# Altium footprint library SAMTEC THD.PcbLib: 161 footprints (part 7 of 12) (continued)
## SAMTEC_SSW-150-01-L-D [mm] "100 Contacts - Pitch 2.54mm - Double Row Through Mount Straight Header"
height 8.51
pads (100):
  round 1.7 hole 1: 1(-62.23,1.27) 2(-62.23,-1.27) 3(-59.69,1.27) 4(-59.69,-1.27) 5(-57.15,1.27) 6(-57.15,-1.27) 7(-54.61,1.27) 8(-54.61,-1.27) 9(-52.07,1.27) 10(-52.07,-1.27) 11(-49.53,1.27) 12(-49.53,-1.27) 13(-46.99,1.27) 14(-46.99,-1.27) 15(-44.45,1.27) 16(-44.45,-1.27) 17(-41.91,1.27) 18(-41.91,-1.27) 19(-39.37,1.27) 20(-39.37,-1.27) 21(-36.83,1.27) 22(-36.83,-1.27) 23(-34.29,1.27) 24(-34.29,-1.27) 25(-31.75,1.27) 26(-31.75,-1.27) 27(-29.21,1.27) 28(-29.21,-1.27) 29(-26.67,1.27) 30(-26.67,-1.27) 31(-24.13,1.27) 32(-24.13,-1.27) 33(-21.59,1.27) 34(-21.59,-1.27) 35(-19.05,1.27) 36(-19.05,-1.27) 37(-16.51,1.27) 38(-16.51,-1.27) 39(-13.97,1.27) 40(-13.97,-1.27) 41(-11.43,1.27) 42(-11.43,-1.27) 43(-8.89,1.27) 44(-8.89,-1.27) 45(-6.35,1.27) 46(-6.35,-1.27) 47(-3.81,1.27) 48(-3.81,-1.27) 49(-1.27,1.27) 50(-1.27,-1.27) 51(1.27,1.27) 52(1.27,-1.27) 53(3.81,1.27) 54(3.81,-1.27) 55(6.35,1.27) 56(6.35,-1.27) 57(8.89,1.27) 58(8.89,-1.27) 59(11.43,1.27) 60(11.43,-1.27) 61(13.97,1.27) 62(13.97,-1.27) 63(16.51,1.27) 64(16.51,-1.27) 65(19.05,1.27) 66(19.05,-1.27) 67(21.59,1.27) 68(21.59,-1.27) 69(24.13,1.27) 70(24.13,-1.27) 71(26.67,1.27) 72(26.67,-1.27) 73(29.21,1.27) 74(29.21,-1.27) 75(31.75,1.27) 76(31.75,-1.27) 77(34.29,1.27) 78(34.29,-1.27) 79(36.83,1.27) 80(36.83,-1.27) 81(39.37,1.27) 82(39.37,-1.27) 83(41.91,1.27) 84(41.91,-1.27) 85(44.45,1.27) 86(44.45,-1.27) 87(46.99,1.27) 88(46.99,-1.27) 89(49.53,1.27) 90(49.53,-1.27) 91(52.07,1.27) 92(52.07,-1.27) 93(54.61,1.27) 94(54.61,-1.27) 95(57.15,1.27) 96(57.15,-1.27) 97(59.69,1.27) 98(59.69,-1.27) 99(62.23,1.27) 100(62.23,-1.27)
Top Overlay:
  circle w0.3: c-62.265,3.135 r0.15
  lines w0.2: -63.754,-2.477 63.754,-2.477 63.754,2.477 -63.754,2.477 -63.754,-2.477
  text "2" at -65.002,-1.843 h1.2
  text "99" at 64.3,0.69 h1.2
  text "100" at 64.3,-1.85 h1.2
  text "1" at -64.752,0.697 h1.2
Mechanical 8:
  drawing of 404 lines, arcs and shapes, not listed
Mechanical 14:
  drawing of 1205 lines, arcs and shapes, not listed
  text "2" at -65.002,-1.843 h1.2
  text "99" at 64.3,0.69 h1.2
  text "100" at 64.3,-1.85 h1.2
  text "1" at -64.752,0.697 h1.2
3D body "SAMTEC_SSW-150-01-L-D.stp": height 8.51, standoff -2.64, extent -63.754,-2.476 63.754,2.477

## SAMTEC_TFM-106-01-L-D-A [mm] "12 Contacts, Pitch 1.27mm, Dual Row Through Mount Straight Header With Alignment Pin, Lead Style Height 5.59mm"
height 5.59
pads (14):
  rrect50% 1.05x1.05 hole 0.65: 1(3.175,0.635) 2(3.175,-0.635) 3(1.905,0.635) 4(1.905,-0.635) 5(0.635,0.635) 6(0.635,-0.635) 7(-0.635,0.635) 8(-0.635,-0.635) 9(-1.905,0.635) 10(-1.905,-0.635) 11(-3.175,0.635) 12(-3.175,-0.635)
  round 0.5 hole 1.4 unplated mask+0.45: MECH1(-4.762,0) MECH2(4.763,0)
Top Overlay:
  circle w0.3: c3.15,3.402 r0.15
  lines w0.2: -5.397,-1.333 -4.508,-1.333 ; -5.397,-0.953 -5.313,-0.953 ; -5.397,-0.898 -5.397,-2.222 -4.762,-2.858 5.398,-2.858 5.398,-0.898 ; -5.397,0.898 -5.397,2.222 -4.762,2.858 5.398,2.858 5.398,0.898 ; -5.397,1.333 -4.508,1.333 ; -4.212,-0.953 -4.127,-0.953 -4.508,-1.333 ; -4.127,-2.222 -4.127,-0.898 ; -4.127,0.898 -4.127,1.714 4.128,1.714 ; -4.127,0.953 -4.508,1.333 ; -1.333,-2.095 4.509,-2.095 ; 4.128,-0.898 4.128,-1.714 ; 4.128,0.898 4.128,1.714 ; 4.212,-0.953 4.128,-0.953 4.509,-1.333 ; 4.212,0.953 4.128,0.953 4.509,1.333 ; 5.313,-0.953 5.398,-0.953 ; 5.313,0.953 5.398,0.953 ; 5.398,-1.333 4.509,-1.333 ; 5.398,1.333 4.509,1.333 ; -4.508,-1.333 -4.508,-2.222 -1.333,-2.222 -1.333,-1.714 4.128,-1.714 ; -4.508,1.333 -4.508,2.095 4.509,2.095 ; 4.128,-1.714 4.509,-2.095 ; 4.128,1.714 4.509,2.095 ; 4.509,-2.095 4.509,-1.333 ; 4.509,1.333 4.509,2.095
  text "1" at 3.918,3.302 h1
Mechanical 8:
  lines w0.1: -5.262,0 -4.762,0 ; -4.762,-0.5 -4.762,0 ; -4.762,0.5 -4.762,0 ; -4.262,0 -4.762,0 ; -3.675,-0.635 -3.175,-0.635 ; -3.675,0.635 -3.175,0.635 ; -3.175,-1.135 -3.175,-0.635 ; -3.175,-0.135 -3.175,-0.635 ; -3.175,0.135 -3.175,0.635 ; -3.175,1.135 -3.175,0.635 ; -2.675,-0.635 -3.175,-0.635 ; -2.675,0.635 -3.175,0.635 ; -2.405,-0.635 -1.905,-0.635 ; -2.405,0.635 -1.905,0.635 ; -1.905,-1.135 -1.905,-0.635 ; -1.905,-0.135 -1.905,-0.635 ; -1.905,0.135 -1.905,0.635 ; -1.905,1.135 -1.905,0.635 ; -1.405,-0.635 -1.905,-0.635 ; -1.405,0.635 -1.905,0.635 ; -1.135,-0.635 -0.635,-0.635 ; -1.135,0.635 -0.635,0.635 ; -0.635,-1.135 -0.635,-0.635 ; -0.635,-0.135 -0.635,-0.635 ; -0.635,0.135 -0.635,0.635 ; -0.635,1.135 -0.635,0.635 ; -0.354,-0.354 0,0 ; -0.354,0.354 0,0 ; -0.135,-0.635 -0.635,-0.635 ; -0.135,0.635 -0.635,0.635 ; 0.135,-0.635 0.635,-0.635 ; 0.135,0.635 0.635,0.635 ; 0.354,-0.354 0,0 ; 0.354,0.354 0,0 ; 0.635,-1.135 0.635,-0.635 ; 0.635,-0.135 0.635,-0.635 ; 0.635,0.135 0.635,0.635 ; 0.635,1.135 0.635,0.635 ; 1.135,-0.635 0.635,-0.635 ; 1.135,0.635 0.635,0.635 ; 1.405,-0.635 1.905,-0.635 ; 1.405,0.635 1.905,0.635 ; 1.905,-1.135 1.905,-0.635 ; 1.905,-0.135 1.905,-0.635 ; 1.905,0.135 1.905,0.635 ; 1.905,1.135 1.905,0.635 ; 2.405,-0.635 1.905,-0.635 ; 2.405,0.635 1.905,0.635 ; 2.675,-0.635 3.175,-0.635 ; 2.675,0.635 3.175,0.635 ; 3.175,-1.135 3.175,-0.635 ; 3.175,-0.135 3.175,-0.635 ; 3.175,0.135 3.175,0.635 ; 3.175,1.135 3.175,0.635 ; 3.675,-0.635 3.175,-0.635 ; 3.675,0.635 3.175,0.635 ; 4.263,0 4.763,0 ; 4.763,-0.5 4.763,0 ; 4.763,0.5 4.763,0 ; 5.263,0 4.763,0
Mechanical 14:
  circle w0.1: c3.175,-0.635 r0.229
  circle w0.1: c3.175,0.635 r0.229
  circle w0.1: c1.905,-0.635 r0.229
  circle w0.1: c1.905,0.635 r0.229
  circle w0.1: c0.635,-0.635 r0.229
  circle w0.1: c0.635,0.635 r0.229
  circle w0.1: c-0.635,-0.635 r0.229
  circle w0.1: c-0.635,0.635 r0.229
  circle w0.1: c-1.905,-0.635 r0.229
  circle w0.1: c-1.905,0.635 r0.229
  circle w0.1: c-3.175,-0.635 r0.229
  circle w0.1: c-3.175,0.635 r0.229
  circle w0.3: c3.15,3.402 r0.15
  lines w0.1: -5.397,-1.333 -4.508,-1.333 ; -5.397,-0.953 -4.127,-0.953 -4.508,-1.333 ; -5.397,1.333 -4.508,1.333 ; -4.127,-2.222 -4.127,1.714 4.128,1.714 ; -4.127,0.953 -4.508,1.333 ; -1.333,-2.095 4.509,-2.095 ; 5.398,-1.333 4.509,-1.333 ; 5.398,-0.953 4.128,-0.953 4.509,-1.333 ; 5.398,0.953 4.128,0.953 4.509,1.333 ; 5.398,1.333 4.509,1.333 ; -4.508,-1.333 -4.508,-2.222 -1.333,-2.222 -1.333,-1.714 4.128,-1.714 ; -4.508,1.333 -4.508,2.095 4.509,2.095 ; 4.128,-1.714 4.128,1.714 ; 4.128,-1.714 4.509,-2.095 ; 4.128,1.714 4.509,2.095 ; 4.509,-2.095 4.509,-1.333 ; 4.509,1.333 4.509,2.095 ; -5.397,-2.222 -4.762,-2.858 5.398,-2.858 5.398,2.858 -4.762,2.858 -5.397,2.222 -5.397,-2.222
  text "1" at 3.918,3.302 h1
3D body "SAMTEC_TFM-106-01-L-D-A.stp": height 5.59, standoff -1.97, extent -5.397,-2.857 5.398,2.858

## SAMTEC_TFM-130-31-L-D-A [mm] "60 Contacts, Pitch 1.27mm, Dual Row Through Mount Straight Header With Alignment Pin, Lead Style Height 11.05mm"
height 11.05
pads (62):
  rrect50% 1.05x1.05 hole 0.65: 1(18.415,0.635) 2(18.415,-0.635) 3(17.145,0.635) 4(17.145,-0.635) 5(15.875,0.635) 6(15.875,-0.635) 7(14.605,0.635) 8(14.605,-0.635) 9(13.335,0.635) 10(13.335,-0.635) 11(12.065,0.635) 12(12.065,-0.635) 13(10.795,0.635) 14(10.795,-0.635) 15(9.525,0.635) 16(9.525,-0.635) 17(8.255,0.635) 18(8.255,-0.635) 19(6.985,0.635) 20(6.985,-0.635) 21(5.715,0.635) 22(5.715,-0.635) 23(4.445,0.635) 24(4.445,-0.635) 25(3.175,0.635) 26(3.175,-0.635) 27(1.905,0.635) 28(1.905,-0.635) 29(0.635,0.635) 30(0.635,-0.635) 31(-0.635,0.635) 32(-0.635,-0.635) 33(-1.905,0.635) 34(-1.905,-0.635) 35(-3.175,0.635) 36(-3.175,-0.635) 37(-4.445,0.635) 38(-4.445,-0.635) 39(-5.715,0.635) 40(-5.715,-0.635) 41(-6.985,0.635) 42(-6.985,-0.635) 43(-8.255,0.635) 44(-8.255,-0.635) 45(-9.525,0.635) 46(-9.525,-0.635) 47(-10.795,0.635) 48(-10.795,-0.635) 49(-12.065,0.635) 50(-12.065,-0.635) 51(-13.335,0.635) 52(-13.335,-0.635) 53(-14.605,0.635) 54(-14.605,-0.635) 55(-15.875,0.635) 56(-15.875,-0.635) 57(-17.145,0.635) 58(-17.145,-0.635) 59(-18.415,0.635) 60(-18.415,-0.635)
  round 0.5 hole 1.4 unplated mask+0.45: MECH1(-20.005,0) MECH2(20.005,0)
Top Overlay:
  circle w0.3: c18.39,3.402 r0.15
  lines w0.2: -20.637,-1.333 -19.748,-1.333 ; -20.637,-0.838 -20.637,-2.222 -20.002,-2.857 20.637,-2.857 20.637,-0.838 ; -20.637,0.838 -20.637,2.222 -20.002,2.857 20.637,2.857 20.637,0.838 ; -20.637,1.333 -19.748,1.333 ; -19.367,-2.222 -19.367,-0.834 ; -19.367,-0.953 -19.748,-1.333 ; -19.367,0.834 -19.367,1.714 ; -19.367,0.953 -19.748,1.333 ; -16.573,-2.095 19.748,-2.095 ; 19.367,-0.953 19.748,-1.333 ; 19.367,-0.834 19.367,-1.714 ; 19.367,0.834 19.367,1.714 ; 19.367,0.953 19.748,1.333 ; 20.637,-1.333 19.748,-1.333 ; 20.637,1.333 19.748,1.333 ; -19.748,-1.333 -19.748,-2.222 -16.573,-2.222 -16.573,-1.714 19.367,-1.714 ; -19.748,1.333 -19.748,2.095 ; -19.748,2.095 19.748,2.095 ; -19.748,2.095 -19.367,1.714 ; -19.367,1.714 19.367,1.714 ; 19.367,-1.714 19.748,-2.095 ; 19.367,1.714 19.748,2.095 ; 19.748,-2.095 19.748,-1.333 ; 19.748,1.333 19.748,2.095
  text "1" at 19.158,3.302 h1
Mechanical 8:
  drawing of 252 lines, arcs and shapes, not listed
Mechanical 14:
  circle w0.1: c18.415,-0.635 r0.229
  circle w0.1: c17.145,-0.635 r0.229
  circle w0.1: c17.145,0.635 r0.229
  circle w0.1: c18.415,0.635 r0.229
  circle w0.1: c-17.145,0.635 r0.229
  circle w0.1: c-17.145,-0.635 r0.229
  circle w0.1: c-18.415,0.635 r0.229
  circle w0.1: c-18.415,-0.635 r0.229
  circle w0.3: c18.39,3.402 r0.15
  lines w0.1: -20.637,-1.333 -19.748,-1.333 ; -20.637,-0.953 -19.367,-0.953 -19.748,-1.333 ; -20.637,0.953 -19.367,0.953 -19.748,1.333 ; -20.637,1.333 -19.748,1.333 ; -19.367,-2.222 -19.367,1.714 ; -16.573,-2.095 19.748,-2.095 ; 20.637,-1.333 19.748,-1.333 ; 20.637,-0.953 19.367,-0.953 19.748,-1.333 ; 20.637,0.953 19.367,0.953 19.748,1.333 ; 20.637,1.333 19.748,1.333 ; -19.748,-1.333 -19.748,-2.222 -16.573,-2.222 -16.573,-1.714 19.367,-1.714 ; -19.748,1.333 -19.748,2.095 ; -19.748,2.095 19.748,2.095 ; -19.748,2.095 -19.367,1.714 ; -19.367,1.714 19.367,1.714 ; 19.367,-1.714 19.748,-2.095 ; 19.367,-1.714 19.367,1.714 ; 19.367,1.714 19.748,2.095 ; 19.748,-2.095 19.748,-1.333 ; 19.748,1.333 19.748,2.095 ; -20.637,-2.222 -20.637,2.222 -20.002,2.857 20.637,2.857 20.637,-2.857 -20.002,-2.857 -20.637,-2.222
  text "1" at 19.158,3.302 h1
3D body "SAMTEC_TFM-130-31-L-D-A.stp": height 11.05, standoff -2.03, extent -20.637,-2.857 20.638,2.858

## SAMTEC_TFML-110-01-S-D-RA [mm] "20 Contacts - Pitch 1.27mm - Dual Row Right Angle Through-Hole Header"
height 5.72
pads (20):
  rrect50% 1.05x1.05 hole 0.65: 1(5.715,0.635) 2(5.715,-0.635) 3(4.445,0.635) 4(4.445,-0.635) 5(3.175,0.635) 6(3.175,-0.635) 7(1.905,0.635) 8(1.905,-0.635) 9(0.635,0.635) 10(0.635,-0.635) 11(-0.635,0.635) 12(-0.635,-0.635) 13(-1.905,0.635) 14(-1.905,-0.635) 15(-3.175,0.635) 16(-3.175,-0.635) 17(-4.445,0.635) 18(-4.445,-0.635) 19(-5.715,0.635) 20(-5.715,-0.635)
Top Overlay:
  circle w0.3: c6.975,0.375 r0.15
  lines w0.2: -6.668,1.651 6.668,1.651 ; -6.668,2.678 6.668,2.678 ; -6.668,6.731 -6.668,1.143 -7.938,1.143 -7.938,6.731 7.938,6.731 7.938,1.143 6.668,1.143 6.668,6.731 ; -0.064,2.678 -0.064,3.429 3.747,3.429 3.747,2.678 ; 0.406,2.678 0.406,3.429 ; 0.864,2.678 0.864,3.429 ; 1.676,2.678 1.676,3.429 ; 2.134,2.678 2.134,3.429 ; 2.946,2.678 2.946,3.429 ; 3.404,2.678 3.404,3.429
  text "20" at -6.797,-1.222 h1.2
Mechanical 8:
  lines w0.1: -6.215,-0.635 -5.715,-0.635 ; -6.215,0.635 -5.715,0.635 ; -5.715,-1.135 -5.715,-0.635 ; -5.715,-0.135 -5.715,-0.635 ; -5.715,0.135 -5.715,0.635 ; -5.715,1.135 -5.715,0.635 ; -5.215,-0.635 -5.715,-0.635 ; -5.215,0.635 -5.715,0.635 ; -4.945,-0.635 -4.445,-0.635 ; -4.945,0.635 -4.445,0.635 ; -4.445,-1.135 -4.445,-0.635 ; -4.445,-0.135 -4.445,-0.635 ; -4.445,0.135 -4.445,0.635 ; -4.445,1.135 -4.445,0.635 ; -3.945,-0.635 -4.445,-0.635 ; -3.945,0.635 -4.445,0.635 ; -3.675,-0.635 -3.175,-0.635 ; -3.675,0.635 -3.175,0.635 ; -3.175,-1.135 -3.175,-0.635 ; -3.175,-0.135 -3.175,-0.635 ; -3.175,0.135 -3.175,0.635 ; -3.175,1.135 -3.175,0.635 ; -2.675,-0.635 -3.175,-0.635 ; -2.675,0.635 -3.175,0.635 ; -2.405,-0.635 -1.905,-0.635 ; -2.405,0.635 -1.905,0.635 ; -1.905,-1.135 -1.905,-0.635 ; -1.905,-0.135 -1.905,-0.635 ; -1.905,0.135 -1.905,0.635 ; -1.905,1.135 -1.905,0.635 ; -1.405,-0.635 -1.905,-0.635 ; -1.405,0.635 -1.905,0.635 ; -1.135,-0.635 -0.635,-0.635 ; -1.135,0.635 -0.635,0.635 ; -0.635,-1.135 -0.635,-0.635 ; -0.635,-0.135 -0.635,-0.635 ; -0.635,0.135 -0.635,0.635 ; -0.635,1.135 -0.635,0.635 ; -0.5,0 0,0 ; -0.135,-0.635 -0.635,-0.635 ; -0.135,0.635 -0.635,0.635 ; 0,-0.5 0,0 ; 0,0.5 0,0 ; 0.135,-0.635 0.635,-0.635 ; 0.135,0.635 0.635,0.635 ; 0.5,0 0,0 ; 0.635,-1.135 0.635,-0.635 ; 0.635,-0.135 0.635,-0.635 ; 0.635,0.135 0.635,0.635 ; 0.635,1.135 0.635,0.635 ; 1.135,-0.635 0.635,-0.635 ; 1.135,0.635 0.635,0.635 ; 1.405,-0.635 1.905,-0.635 ; 1.405,0.635 1.905,0.635 ; 1.905,-1.135 1.905,-0.635 ; 1.905,-0.135 1.905,-0.635 ; 1.905,0.135 1.905,0.635 ; 1.905,1.135 1.905,0.635 ; 2.405,-0.635 1.905,-0.635 ; 2.405,0.635 1.905,0.635 ; 2.675,-0.635 3.175,-0.635 ; 2.675,0.635 3.175,0.635 ; 3.175,-1.135 3.175,-0.635 ; 3.175,-0.135 3.175,-0.635 ; 3.175,0.135 3.175,0.635 ; 3.175,1.135 3.175,0.635 ; 3.675,-0.635 3.175,-0.635 ; 3.675,0.635 3.175,0.635 ; 3.945,-0.635 4.445,-0.635 ; 3.945,0.635 4.445,0.635 ; 4.445,-1.135 4.445,-0.635 ; 4.445,-0.135 4.445,-0.635 ; 4.445,0.135 4.445,0.635 ; 4.445,1.135 4.445,0.635 ; 4.945,-0.635 4.445,-0.635 ; 4.945,0.635 4.445,0.635 ; 5.215,-0.635 5.715,-0.635 ; 5.215,0.635 5.715,0.635 ; 5.715,-1.135 5.715,-0.635 ; 5.715,-0.135 5.715,-0.635 ; 5.715,0.135 5.715,0.635 ; 5.715,1.135 5.715,0.635 ; 6.215,-0.635 5.715,-0.635 ; 6.215,0.635 5.715,0.635
Mechanical 14:
  circle w0.3: c6.975,0.375 r0.15
  lines w0.1: -6.668,1.651 6.668,1.651 ; -6.668,2.678 6.668,2.678 ; -6.668,6.731 -6.668,1.143 -7.938,1.143 -7.938,6.731 7.938,6.731 7.938,1.143 6.668,1.143 6.668,6.731 ; -5.893,1.651 -5.893,-0.762 -5.537,-0.762 -5.537,1.651 ; -4.623,1.651 -4.623,-0.762 -4.267,-0.762 -4.267,1.651 ; -3.353,1.651 -3.353,-0.762 -2.997,-0.762 -2.997,1.651 ; -2.083,1.651 -2.083,-0.762 -1.727,-0.762 -1.727,1.651 ; -0.813,1.651 -0.813,-0.762 -0.457,-0.762 -0.457,1.651 ; -0.064,2.678 -0.064,3.429 3.747,3.429 3.747,2.678 ; 0.406,2.678 0.406,3.429 ; 0.457,1.651 0.457,-0.762 0.813,-0.762 0.813,1.651 ; 0.864,2.678 0.864,3.429 ; 1.676,2.678 1.676,3.429 ; 1.727,1.651 1.727,-0.762 2.083,-0.762 2.083,1.651 ; 2.134,2.678 2.134,3.429 ; 2.946,2.678 2.946,3.429 ; 2.997,1.651 2.997,-0.762 3.353,-0.762 3.353,1.651 ; 3.404,2.678 3.404,3.429 ; 4.267,1.651 4.267,-0.762 4.623,-0.762 4.623,1.651 ; 5.537,1.651 5.537,-0.762 5.893,-0.762 5.893,1.651
  text "20" at -6.797,-1.222 h1.2
3D body "SAMTEC_TFML-110-01-S-D-RA.stp": height 5.71, standoff -1.91, extent -7.937,-0.762 7.938,6.731

## SAMTEC_TFML-115-01-S-D-RA [mm] "30 Contacts - Pitch 1.27mm - Dual Row Right Angle Through-Hole Header"
height 5.72
pads (30):
  rrect50% 1.05x1.05 hole 0.65: 1(8.89,0.635) 2(8.89,-0.635) 3(7.62,0.635) 4(7.62,-0.635) 5(6.35,0.635) 6(6.35,-0.635) 7(5.08,0.635) 8(5.08,-0.635) 9(3.81,0.635) 10(3.81,-0.635) 11(2.54,0.635) 12(2.54,-0.635) 13(1.27,0.635) 14(1.27,-0.635) 15(0,0.635) 16(0,-0.635) 17(-1.27,0.635) 18(-1.27,-0.635) 19(-2.54,0.635) 20(-2.54,-0.635) 21(-3.81,0.635) 22(-3.81,-0.635) 23(-5.08,0.635) 24(-5.08,-0.635) 25(-6.35,0.635) 26(-6.35,-0.635) 27(-7.62,0.635) 28(-7.62,-0.635) 29(-8.89,0.635) 30(-8.89,-0.635)
Top Overlay:
  circle w0.3: c10.15,0.375 r0.15
  lines w0.2: -9.843,1.651 9.843,1.651 ; -1.499,2.678 -1.499,3.429 ; -1.046,2.678 -1.046,3.429 ; -0.229,2.678 -0.229,3.429 ; 0.229,2.678 0.229,3.429 ; 1.041,2.678 1.041,3.429 ; 1.499,2.678 1.499,3.429 ; -11.113,1.143 -11.113,6.731 11.113,6.731 11.113,1.143 9.843,1.143 9.843,2.678 -9.843,2.678 -9.843,1.143 -11.113,1.143 ; -1.968,1.981 1.841,1.981 1.841,3.429 -1.968,3.429 -1.968,1.981
  text "30" at -10.022,-1.247 h1.2
Mechanical 8:
  lines w0.1: -9.39,-0.635 -8.89,-0.635 ; -9.39,0.635 -8.89,0.635 ; -8.89,-1.135 -8.89,-0.635 ; -8.89,-0.135 -8.89,-0.635 ; -8.89,0.135 -8.89,0.635 ; -8.89,1.135 -8.89,0.635 ; -8.39,-0.635 -8.89,-0.635 ; -8.39,0.635 -8.89,0.635 ; -8.12,-0.635 -7.62,-0.635 ; -8.12,0.635 -7.62,0.635 ; -7.62,-1.135 -7.62,-0.635 ; -7.62,-0.135 -7.62,-0.635 ; -7.62,0.135 -7.62,0.635 ; -7.62,1.135 -7.62,0.635 ; -7.12,-0.635 -7.62,-0.635 ; -7.12,0.635 -7.62,0.635 ; -6.85,-0.635 -6.35,-0.635 ; -6.85,0.635 -6.35,0.635 ; -6.35,-1.135 -6.35,-0.635 ; -6.35,-0.135 -6.35,-0.635 ; -6.35,0.135 -6.35,0.635 ; -6.35,1.135 -6.35,0.635 ; -5.85,-0.635 -6.35,-0.635 ; -5.85,0.635 -6.35,0.635 ; -5.58,-0.635 -5.08,-0.635 ; -5.58,0.635 -5.08,0.635 ; -5.08,-1.135 -5.08,-0.635 ; -5.08,-0.135 -5.08,-0.635 ; -5.08,0.135 -5.08,0.635 ; -5.08,1.135 -5.08,0.635 ; -4.58,-0.635 -5.08,-0.635 ; -4.58,0.635 -5.08,0.635 ; -4.31,-0.635 -3.81,-0.635 ; -4.31,0.635 -3.81,0.635 ; -3.81,-1.135 -3.81,-0.635 ; -3.81,-0.135 -3.81,-0.635 ; -3.81,0.135 -3.81,0.635 ; -3.81,1.135 -3.81,0.635 ; -3.31,-0.635 -3.81,-0.635 ; -3.31,0.635 -3.81,0.635 ; -3.04,-0.635 -2.54,-0.635 ; -3.04,0.635 -2.54,0.635 ; -2.54,-1.135 -2.54,-0.635 ; -2.54,-0.135 -2.54,-0.635 ; -2.54,0.135 -2.54,0.635 ; -2.54,1.135 -2.54,0.635 ; -2.04,-0.635 -2.54,-0.635 ; -2.04,0.635 -2.54,0.635 ; -1.77,-0.635 -1.27,-0.635 ; -1.77,0.635 -1.27,0.635 ; -1.27,-1.135 -1.27,-0.635 ; -1.27,-0.135 -1.27,-0.635 ; -1.27,0.135 -1.27,0.635 ; -1.27,1.135 -1.27,0.635 ; -0.77,-0.635 -1.27,-0.635 ; -0.77,0.635 -1.27,0.635 ; -0.5,-0.635 0,-0.635 ; -0.5,0 0,0 ; -0.5,0.635 0,0.635 ; 0,-1.135 0,-0.635 ; 0,-0.5 0,0 ; 0,-0.135 0,-0.635 ; 0,0.135 0,0.635 ; 0,0.5 0,0 ; 0,1.135 0,0.635 ; 0.5,-0.635 0,-0.635 ; 0.5,0 0,0 ; 0.5,0.635 0,0.635 ; 0.77,-0.635 1.27,-0.635 ; 0.77,0.635 1.27,0.635 ; 1.27,-1.135 1.27,-0.635 ; 1.27,-0.135 1.27,-0.635 ; 1.27,0.135 1.27,0.635 ; 1.27,1.135 1.27,0.635 ; 1.77,-0.635 1.27,-0.635 ; 1.77,0.635 1.27,0.635 ; 2.04,-0.635 2.54,-0.635 ; 2.04,0.635 2.54,0.635 ; 2.54,-1.135 2.54,-0.635 ; 2.54,-0.135 2.54,-0.635 ; 2.54,0.135 2.54,0.635 ; 2.54,1.135 2.54,0.635 ; 3.04,-0.635 2.54,-0.635 ; 3.04,0.635 2.54,0.635 ; 3.31,-0.635 3.81,-0.635 ; 3.31,0.635 3.81,0.635 ; 3.81,-1.135 3.81,-0.635 ; 3.81,-0.135 3.81,-0.635 ; 3.81,0.135 3.81,0.635 ; 3.81,1.135 3.81,0.635 ; 4.31,-0.635 3.81,-0.635 ; 4.31,0.635 3.81,0.635 ; 4.58,-0.635 5.08,-0.635 ; 4.58,0.635 5.08,0.635 ; 5.08,-1.135 5.08,-0.635 ; 5.08,-0.135 5.08,-0.635 ; 5.08,0.135 5.08,0.635 ; 5.08,1.135 5.08,0.635 ; 5.58,-0.635 5.08,-0.635 ; 5.58,0.635 5.08,0.635 ; 5.85,-0.635 6.35,-0.635 ; 5.85,0.635 6.35,0.635 ; 6.35,-1.135 6.35,-0.635 ; 6.35,-0.135 6.35,-0.635 ; 6.35,0.135 6.35,0.635 ; 6.35,1.135 6.35,0.635 ; 6.85,-0.635 6.35,-0.635 ; 6.85,0.635 6.35,0.635 ; 7.12,-0.635 7.62,-0.635 ; 7.12,0.635 7.62,0.635 ; 7.62,-1.135 7.62,-0.635 ; 7.62,-0.135 7.62,-0.635 ; 7.62,0.135 7.62,0.635 ; 7.62,1.135 7.62,0.635 ; 8.12,-0.635 7.62,-0.635 ; 8.12,0.635 7.62,0.635 ; 8.39,-0.635 8.89,-0.635 ; 8.39,0.635 8.89,0.635 ; 8.89,-1.135 8.89,-0.635 ; 8.89,-0.135 8.89,-0.635 ; 8.89,0.135 8.89,0.635 ; 8.89,1.135 8.89,0.635 ; 9.39,-0.635 8.89,-0.635 ; 9.39,0.635 8.89,0.635
Mechanical 14:
  circle w0.3: c10.15,0.375 r0.15
  lines w0.1: -9.843,1.651 9.843,1.651 ; -9.068,1.651 -9.068,-0.762 -8.712,-0.762 -8.712,1.651 ; -7.798,1.651 -7.798,-0.762 -7.442,-0.762 -7.442,1.651 ; -6.528,1.651 -6.528,-0.762 -6.172,-0.762 -6.172,1.651 ; -5.258,1.651 -5.258,-0.762 -4.902,-0.762 -4.902,1.651 ; -3.988,1.651 -3.988,-0.762 -3.632,-0.762 -3.632,1.651 ; -2.718,1.651 -2.718,-0.762 -2.362,-0.762 -2.362,1.651 ; -1.499,2.678 -1.499,3.429 ; -1.448,1.651 -1.448,-0.762 -1.092,-0.762 -1.092,1.651 ; -1.046,2.678 -1.046,3.429 ; -0.229,2.678 -0.229,3.429 ; -0.178,1.651 -0.178,-0.762 0.178,-0.762 0.178,1.651 ; 0.229,2.678 0.229,3.429 ; 1.041,2.678 1.041,3.429 ; 1.092,1.651 1.092,-0.762 1.448,-0.762 1.448,1.651 ; 1.499,2.678 1.499,3.429 ; 2.362,1.651 2.362,-0.762 2.718,-0.762 2.718,1.651 ; 3.632,1.651 3.632,-0.762 3.988,-0.762 3.988,1.651 ; 4.902,1.651 4.902,-0.762 5.258,-0.762 5.258,1.651 ; 6.172,1.651 6.172,-0.762 6.528,-0.762 6.528,1.651 ; 7.442,1.651 7.442,-0.762 7.798,-0.762 7.798,1.651 ; 8.712,1.651 8.712,-0.762 9.068,-0.762 9.068,1.651 ; -11.113,1.143 -11.113,6.731 11.113,6.731 11.113,1.143 9.843,1.143 9.843,2.678 -9.843,2.678 -9.843,1.143 -11.113,1.143 ; -1.968,1.981 1.841,1.981 1.841,3.429 -1.968,3.429 -1.968,1.981
  text "30" at -10.022,-1.247 h1.2
3D body "SAMTEC_TFML-115-01-S-D-RA.stp": height 5.71, standoff -1.91, extent -11.112,-0.762 11.113,6.731

## SAMTEC_TLW-101-01-F-D-RA [mm] "2 Contacts, Pitch 2.54mm, Double Row Right Angle Low Profile Strip Header"
height 5.03
pads (2):
  round 1.7 hole 1: 1(0,-1.27) 2(0,1.27)
Top Overlay:
  circle w0.3: c0.035,-3.135 r0.15
  lines w0.2: -1.016,3.175 -1.27,3.175 -1.27,4.318 1.27,4.318 1.27,3.175 1.016,3.175 ; -1.016,4.318 -1.016,2.794 -0.584,2.794 -0.584,3.175 0.584,3.175 0.584,2.794 1.016,2.794 1.016,4.318 ; -0.318,2.427 -0.318,3.175 ; -0.318,4.318 -0.318,9.855 ; 0.318,2.427 0.318,3.175 ; 0.318,4.318 0.318,9.855 ; -0.318,9.855 -0.142,10.16 0.142,10.16 0.318,9.855 ; -0.318,9.855 0.318,9.855
  text "1" at -2.247,-1.768 h1.2
Mechanical 8:
  lines w0.1: -0.5,-1.27 0,-1.27 ; -0.5,0 0,0 ; -0.5,1.27 0,1.27 ; 0,-1.77 0,-1.27 ; 0,-0.77 0,-1.27 ; 0,-0.5 0,0 ; 0,0.5 0,0 ; 0,0.77 0,1.27 ; 0,1.77 0,1.27 ; 0.5,-1.27 0,-1.27 ; 0.5,0 0,0 ; 0.5,1.27 0,1.27
Mechanical 14:
  circle w0.3: c0.035,-3.135 r0.15
  lines w0.1: -1.016,3.175 -1.27,3.175 -1.27,4.318 1.27,4.318 1.27,3.175 1.016,3.175 ; -1.016,4.318 -1.016,2.794 -0.584,2.794 -0.584,3.175 0.584,3.175 0.584,2.794 1.016,2.794 1.016,4.318 ; -0.318,3.175 -0.318,-1.587 0.318,-1.587 0.318,3.175 ; -0.318,4.318 -0.318,9.855 ; 0.318,4.318 0.318,9.855 ; -0.318,9.855 -0.142,10.16 0.142,10.16 0.318,9.855 ; -0.318,9.855 0.318,9.855
  text "1" at -2.247,-1.768 h1.2
3D body "SAMTEC_TLW-101-01-F-D-RA.stp": height 5.03, standoff -3.05, extent -1.27,-1.587 1.27,10.16

## SAMTEC_TLW-106-01-F-S-RA [mm] "6 Contacts - Pitch 2.54mm - Single Row Right Angle Low Profile Strip Header"
height 2.48
pads (6):
  rect 1.7x1.7 hole 1: 1(-6.35,0)
  round 1.7 hole 1: 2(-3.81,0) 3(-1.27,0) 4(1.27,0) 5(3.81,0) 6(6.35,0)
Top Overlay:
  circle w0.3: c-8.05,0 r0.15
  lines w0.2: -7.366,1.905 -7.366,1.524 -6.934,1.524 -6.934,1.905 ; -6.667,1.2 -6.667,1.905 ; -6.667,3.048 -6.667,8.586 ; -6.032,1.2 -6.032,1.905 ; -6.032,3.048 -6.032,8.586 ; -5.766,1.905 -5.766,1.524 -5.334,1.524 -5.334,1.905 ; -5.08,1.905 -5.08,3.048 ; -4.826,1.905 -4.826,1.524 -4.394,1.524 -4.394,1.905 ; -4.127,1.157 -4.127,1.905 ; -4.127,3.048 -4.127,8.586 ; -3.492,1.157 -3.492,1.905 ; -3.492,3.048 -3.492,8.586 ; -3.226,1.905 -3.226,1.524 -2.794,1.524 -2.794,1.905 ; -2.54,1.905 -2.54,3.048 ; -2.286,1.905 -2.286,1.524 -1.854,1.524 -1.854,1.905 ; -1.587,1.157 -1.587,1.905 ; -1.587,3.048 -1.587,8.586 ; -0.952,1.157 -0.952,1.905 ; -0.952,3.048 -0.952,8.586 ; -0.686,1.905 -0.686,1.524 -0.254,1.524 -0.254,1.905 ; 0,1.905 0,3.048 ; 0.254,1.905 0.254,1.524 0.686,1.524 0.686,1.905 ; 0.953,1.157 0.953,1.905 ; 0.953,3.048 0.953,8.586 ; 1.588,1.157 1.588,1.905 ; 1.588,3.048 1.588,8.586 ; 1.854,1.905 1.854,1.524 2.286,1.524 2.286,1.905 ; 2.54,1.905 2.54,3.048 ; 2.794,1.905 2.794,1.524 3.226,1.524 3.226,1.905 ; 3.493,1.157 3.493,1.905 ; 3.493,3.048 3.493,8.586 ; 4.128,1.157 4.128,1.905 ; 4.128,3.048 4.128,8.586 ; 4.394,1.905 4.394,1.524 4.826,1.524 4.826,1.905 ; 5.08,1.905 5.08,3.048 ; 5.334,1.905 5.334,1.524 5.766,1.524 5.766,1.905 ; 6.033,1.157 6.033,1.905 ; 6.033,3.048 6.033,8.586 ; 6.668,1.157 6.668,1.905 ; 6.668,3.048 6.668,8.586 ; 6.934,1.905 6.934,1.524 7.366,1.524 7.366,1.905 ; -6.667,8.586 -6.492,8.89 -6.208,8.89 -6.032,8.586 ; -6.667,8.586 -6.032,8.586 ; -4.127,8.586 -3.952,8.89 -3.668,8.89 -3.492,8.586 ; -4.127,8.586 -3.492,8.586 ; -1.587,8.586 -1.412,8.89 -1.128,8.89 -0.952,8.586 ; -1.587,8.586 -0.952,8.586 ; 0.953,8.586 1.128,8.89 1.412,8.89 1.588,8.586 ; 0.953,8.586 1.588,8.586 ; 3.493,8.586 3.668,8.89 3.952,8.89 4.128,8.586 ; 3.493,8.586 4.128,8.586 ; 6.033,8.586 6.208,8.89 6.492,8.89 6.668,8.586 ; 6.033,8.586 6.668,8.586 ; -7.62,1.905 7.62,1.905 7.62,3.048 -7.62,3.048 -7.62,1.905
Mechanical 8:
  lines w0.1: -6.85,0 -6.35,0 ; -6.35,-0.5 -6.35,0 ; -6.35,0.5 -6.35,0 ; -5.85,0 -6.35,0 ; -4.31,0 -3.81,0 ; -3.81,-0.5 -3.81,0 ; -3.81,0.5 -3.81,0 ; -3.31,0 -3.81,0 ; -1.77,0 -1.27,0 ; -1.27,-0.5 -1.27,0 ; -1.27,0.5 -1.27,0 ; -0.77,0 -1.27,0 ; -0.354,-0.354 0,0 ; -0.354,0.354 0,0 ; 0.354,-0.354 0,0 ; 0.354,0.354 0,0 ; 0.77,0 1.27,0 ; 1.27,-0.5 1.27,0 ; 1.27,0.5 1.27,0 ; 1.77,0 1.27,0 ; 3.31,0 3.81,0 ; 3.81,-0.5 3.81,0 ; 3.81,0.5 3.81,0 ; 4.31,0 3.81,0 ; 5.85,0 6.35,0 ; 6.35,-0.5 6.35,0 ; 6.35,0.5 6.35,0 ; 6.85,0 6.35,0
Mechanical 14:
  circle w0.3: c-8.05,0 r0.15
  lines w0.1: -7.366,1.905 -7.366,1.524 -6.934,1.524 -6.934,1.905 ; -6.667,1.905 -6.667,-0.318 -6.032,-0.318 -6.032,1.905 ; -6.667,3.048 -6.667,8.586 ; -6.032,3.048 -6.032,8.586 ; -5.766,1.905 -5.766,1.524 -5.334,1.524 -5.334,1.905 ; -5.08,1.905 -5.08,3.048 ; -4.826,1.905 -4.826,1.524 -4.394,1.524 -4.394,1.905 ; -4.127,1.905 -4.127,-0.318 -3.492,-0.318 -3.492,1.905 ; -4.127,3.048 -4.127,8.586 ; -3.492,3.048 -3.492,8.586 ; -3.226,1.905 -3.226,1.524 -2.794,1.524 -2.794,1.905 ; -2.54,1.905 -2.54,3.048 ; -2.286,1.905 -2.286,1.524 -1.854,1.524 -1.854,1.905 ; -1.587,1.905 -1.587,-0.318 -0.952,-0.318 -0.952,1.905 ; -1.587,3.048 -1.587,8.586 ; -0.952,3.048 -0.952,8.586 ; -0.686,1.905 -0.686,1.524 -0.254,1.524 -0.254,1.905 ; 0,1.905 0,3.048 ; 0.254,1.905 0.254,1.524 0.686,1.524 0.686,1.905 ; 0.953,1.905 0.953,-0.318 1.588,-0.318 1.588,1.905 ; 0.953,3.048 0.953,8.586 ; 1.588,3.048 1.588,8.586 ; 1.854,1.905 1.854,1.524 2.286,1.524 2.286,1.905 ; 2.54,1.905 2.54,3.048 ; 2.794,1.905 2.794,1.524 3.226,1.524 3.226,1.905 ; 3.493,1.905 3.493,-0.318 4.128,-0.318 4.128,1.905 ; 3.493,3.048 3.493,8.586 ; 4.128,3.048 4.128,8.586 ; 4.394,1.905 4.394,1.524 4.826,1.524 4.826,1.905 ; 5.08,1.905 5.08,3.048 ; 5.334,1.905 5.334,1.524 5.766,1.524 5.766,1.905 ; 6.033,1.905 6.033,-0.318 6.668,-0.318 6.668,1.905 ; 6.033,3.048 6.033,8.586 ; 6.668,3.048 6.668,8.586 ; 6.934,1.905 6.934,1.524 7.366,1.524 7.366,1.905 ; -6.667,8.586 -6.492,8.89 -6.208,8.89 -6.032,8.586 ; -6.667,8.586 -6.032,8.586 ; -4.127,8.586 -3.952,8.89 -3.668,8.89 -3.492,8.586 ; -4.127,8.586 -3.492,8.586 ; -1.587,8.586 -1.412,8.89 -1.128,8.89 -0.952,8.586 ; -1.587,8.586 -0.952,8.586 ; 0.953,8.586 1.128,8.89 1.412,8.89 1.588,8.586 ; 0.953,8.586 1.588,8.586 ; 3.493,8.586 3.668,8.89 3.952,8.89 4.128,8.586 ; 3.493,8.586 4.128,8.586 ; 6.033,8.586 6.208,8.89 6.492,8.89 6.668,8.586 ; 6.033,8.586 6.668,8.586 ; -7.62,1.905 7.62,1.905 7.62,3.048 -7.62,3.048 -7.62,1.905
3D body "SAMTEC_TLW-106-01-F-S-RA.stp": height 2.49, standoff -3.05, extent -7.62,-0.317 7.62,8.89